# Altium footprint library THU VIEN PCB.PCBLib: 534 footprints (part 25 of 34)
Each footprint in its own frame and in the unit in brackets; x right, y up, seen from the top. Pads: shape width x height; smd on the part's side, far side on the other; paste and mask are expansions set on the pad; w line width, h text height; cw(c..) or ccw(c..) is an arc to the next point about the centre after c.
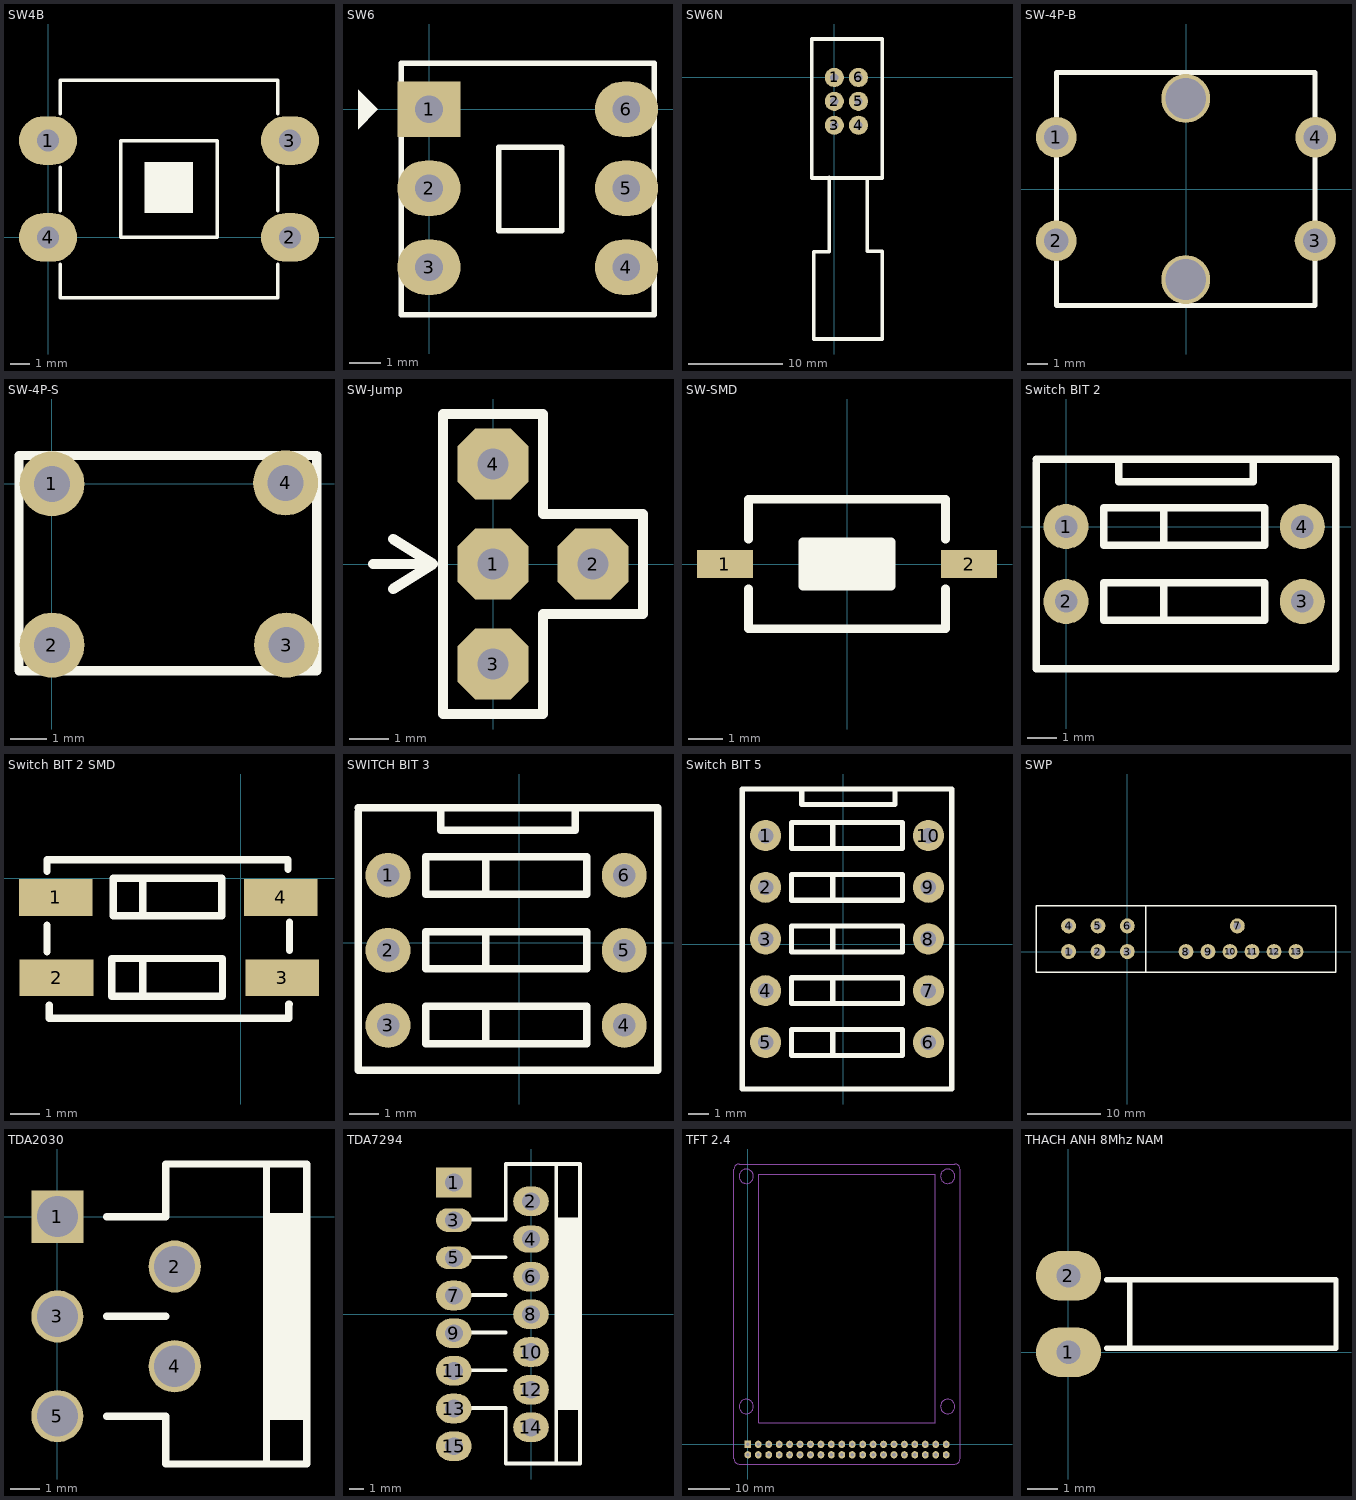
[diagram p24: the footprints below, top view; thin cyan lines are the x and y axes]

## SW4B [mil] "SW button 4pin, 450 x 450 mil"
height 100
pads (4):
  oval 120x100 hole 45: 1(0,200) 2(500,0) 3(500,200) 4(0,0)
Top Overlay:
  rectangle: 199,50 300,156
  lines w7: 25,-55 25,-125 475,-125 475,-55 ; 25,55 25,145 ; 25,255 25,325 475,325 475,255 ; 475,55 475,145 ; 150,0 350,0 350,200 150,200 150,0
3D body "SW3dPS-omron b3w-4000 switch.STEP": height 169.29, standoff -57.09, extent -3.21,-129.22 469.23,343.23

## SW6 [mil] "SW DTDP - 6Pin 260x300x300 mil"
pads (6):
  rect 80x70 hole 35: 1(0,0)
  oval 80x70 hole 35: 2(0,-100) 3(0,-200) 4(250,-200) 5(250,-100) 6(250,0)
Top Overlay:
  region: -90,25 -65,0 -90,-25
  lines w7: -35,-260 -35,58 285,58 285,-260 -35,-260 ; 88,-154 88,-48 168,-48 168,-154 88,-154
3D body "User Library-PSM1-0-0.STEP": height 532.1, standoff -137.19, extent -33.48,-259.48 281.48,55.49

## SW6N [mil]
pads (6):
  round 80 hole 35: 1(0,0) 2(0,-100) 3(0,-200) 4(101,-200) 5(101,-100) 6(101,0)
Top Overlay:
  lines w15: -21,-419 -21,-730 -87,-730 -87,-1095 201,-1095 201,-728 137,-728 137,-421 142,-421 ; -95,-421 -95,161 200,161 200,-421 -95,-421
3D body "User Library-DPDT Push Switch-1.STEP": height 394.31, standoff -156.88, extent -95,-1096.66 200.28,161.56

## SW-4P-B [mm] "Nut bam lon"
pads (6):
  round 2 hole 1.2: 1(-6.375,2.54) 2(-6.375,-2.54) 3(6.325,-2.54) 4(6.35,2.54)
  round 2.4 hole 2: ""(-0.025,-4.445) ""(-0.025,4.445)
Top Overlay:
  lines w0.254: -6.375,-5.715 6.325,-5.715 6.325,5.715 -6.375,5.715 -6.375,-5.715
3D body "User Library-Button-BIG-4.step": height 9.5, standoff -3.5, extent -6.936,-6 6.937,6

## SW-4P-S [mm]
height 5.59
pads (4):
  round 1.8 hole 1: 1(0,0) 2(0,-4.47) 3(6.502,-4.47) 4(6.477,0.025)
Top Overlay:
  lines w0.254: -0.914,-5.182 7.341,-5.182 7.341,0.787 6.934,0.787 -0.914,0.787 -0.914,-5.182
3D body "User Library-Button-small-4pin.step": height 9.52, standoff -3.48, extent -0.864,-5.235 7.348,0.765

## SW-Jump [mm]
pads (4):
  oct 1.8x1.8 hole 0.8: 1(0,0) 2(2.54,0) 3(0,-2.54) 4(0,2.54)
Top Overlay:
  lines w0.254: -3.048,0 -1.524,0 ; -2.54,-0.635 -1.524,0 ; -2.54,0.635 -1.524,0 ; -1.27,-3.81 1.27,-3.81 1.27,-1.27 3.81,-1.27 3.81,1.27 1.27,1.27 1.27,3.81 -1.27,3.81 -1.27,-1.27 -1.27,1.27 -1.27,-3.81

## SW-SMD [mm] "Switch SMD type"
pads (2):
  rect 1.6x0.8 smd: 1(-3.5,0) 2(3.5,0)
Top Overlay:
  rectangle: -1.27,-0.635 1.27,0.635
  lines w0.254: -2.819,-0.711 -2.819,-1.854 2.819,-1.854 2.819,-0.711 ; -2.819,0.711 -2.819,1.854 2.819,1.854 2.819,0.711 ; -1.27,-0.635 -1.27,0.635 1.27,0.635 1.27,-0.635 -1.27,-0.635
3D body "User Library-Button-SMD.step": height 2.5, standoff 0, extent -3.05,-1.85 3.05,1.85

## Switch BIT 2 [mil]
pads (4):
  round 60 hole 30: 1(0,0) 2(0,-100) 3(315,-100) 4(315,0)
Top Overlay:
  lines w10: -40,85 -40,-190 360,-190 360,90 -40,90 ; 70,85 70,60 250,60 250,85 ; 130,-125 130,-75 ; 130,-25 130,20 ; 50,-125 265,-125 265,-75 50,-75 50,-125 ; 50,-25 50,25 265,25 265,-25 50,-25
3D body "DIP Switch 2.step": height 272.26, standoff -125.38, extent -44,-183 356,76.84

## Switch BIT 2 SMD [mil]
pads (4):
  rect 100x50 smd: 1(-251,-26) 2(-250,-135) 3(56,-135) 4(54,-26)
Top Overlay:
  lines w10: -263,-100 -263,-64 ; -263,9 -263,25 -249,25 ; -260,-172 -260,-190 65,-190 65,-171 66,-171 ; -248,25 64,25 64,12 ; -133,-157 -133,-112 ; -133,-49 -133,0 -132,0 ; 66,-98 66,-60 ; -175,-160 -175,-109 -25,-109 -25,-160 -175,-160 ; -173,-51 -173,0 -26,0 -26,-51 -173,-51
3D body "Switch 2.step": height 165.96, standoff 0.6, extent -247,-182 53,18

## SWITCH BIT 3 [mil]
pads (6):
  round 60 hole 30: 1(-175,90) 2(-175,-10) 3(-175,-110) 4(140,-110) 5(140,-10) 6(140,90)
Top Overlay:
  lines w10: -215,175 -215,-170 185,-170 185,180 -215,180 ; -105,175 -105,150 75,150 75,175 ; -45,-135 -45,-85 ; -45,-35 -45,15 ; -45,65 -45,110 ; -125,-135 90,-135 90,-85 -125,-85 -125,-135 ; -125,-35 -125,15 90,15 90,-35 -125,-35 ; -125,65 90,65 90,115 -125,115 -125,65
3D body "User Library-DIP-Schalter SMD 3polig RM2 54.step": height 165.96, standoff 0.6, extent -170,-160 130,140

## Switch BIT 5 [mil]
pads (10):
  round 60 hole 30: 1(-150,210) 2(-150,110) 3(-150,10) 4(-150,-90) 5(-150,-190) 6(165,-190) 7(165,-90) 8(165,10) 9(165,110) 10(165,210)
Top Overlay:
  lines w10: -80,295 -80,270 100,270 100,295 ; -20,-215 -20,-165 ; -20,-115 -20,-65 ; -20,-15 -20,35 ; -20,85 -20,135 ; -20,185 -20,230 ; -195,-280 -195,300 210,300 210,-280 -195,-280 ; -100,-215 115,-215 115,-165 -100,-165 -100,-215 ; -100,-115 115,-115 115,-65 -100,-65 -100,-115 ; -100,-15 115,-15 115,35 -100,35 -100,-15 ; -100,85 -100,135 115,135 115,85 -100,85 ; -100,185 115,185 115,235 -100,235 -100,185
3D body "Switch 5.step": height 130.52, standoff -34.83, extent -140,-240 160,260

## SWP [mil] "SW Power"
height 100
pads (13):
  round 80 hole 40: 1(-314.96,0) 2(-157.48,0) 3(0,0) 4(-314.96,137.8) 5(-157.48,137.8) 6(0,137.8) 7(590.55,137.8) 8(314.96,0) 9(433.07,0) 10(551.18,0) 11(669.29,0) 12(787.4,0) 13(905.51,0)
Top Overlay:
  lines w8: 100,-109.33 100,245 ; -490,-110 1120,-110 1120,245 -490,245 -490,-110

## TDA2030 [mm]
pads (5):
  rect 1.778x1.778 hole 1.4 unplated: 1(0,0)
  round 1.778 hole 1.4 unplated: 2(4,-1.7) 3(0,-3.4) 4(4,-5.1) 5(0,-6.8)
Top Overlay:
  rectangle: 7.13,-6.807 8.5,0
  lines w0.254: 1.676,-6.8 3.7,-6.8 3.7,-8.433 8.5,-8.433 8.5,-3.404 8.5,1.796 3.7,1.796 3.7,0 1.676,0 ; 1.676,-3.4 3.7,-3.4 ; 7.13,-8.433 7.13,0 ; 7.13,-6.8 8.5,-6.8 ; 7.13,1.796 7.13,0 ; 8.5,0 7.13,0

## TDA7294 [mm]
pads (15):
  rect 2.4x2 hole 1.2: 1(-5.219,8.889)
  oval 2.4x2 hole 1.2: 2(-0.019,7.619) 6(-0.019,2.539) 7(-5.219,1.269) 8(-0.019,-0.001) 9(-5.219,-1.271) 10(-0.019,-2.541) 11(-5.219,-3.811) 12(-0.019,-5.081) 13(-5.219,-6.351) 14(-0.019,-7.621) 15(-5.219,-8.891)
  oval 2.4x1.6 hole 1.2: 3(-5.219,6.349)
  oval 2.4x1.8 hole 1.2: 4(-0.019,5.079)
  oval 2.4x1.5 hole 1.2: 5(-5.219,3.809)
Top Overlay:
  rectangle: 1.681,-6.26 3.281,6.389
  lines w0.254: -4.742,-6.311 -1.719,-6.311 ; -4.742,-3.771 -1.719,-3.771 ; -4.742,-1.231 -1.719,-1.231 ; -4.742,1.309 -1.719,1.309 ; -4.742,3.849 -1.719,3.849 ; -4.742,6.389 -1.719,6.389 -1.719,10.139 3.281,10.139 3.281,0.039 3.281,-10.061 -1.719,-10.061 -1.719,-6.311 ; -1.719,-7.682 -1.719,-6.311 ; 1.681,-10.061 1.681,8.625 1.681,10.139 ; 1.681,-6.311 3.281,-6.311 3.281,-8.241 ; 1.681,6.389 3.281,6.389

## TFT 2.4 [mil]
pads (40):
  rect 65x70 hole 35: 1(-0.86,-0.98)
  oval 65x70 hole 35: 2(99.14,-0.98) 3(199.14,-0.98) 4(299.14,-0.98) 5(399.14,-0.98) 6(499.14,-0.98) 7(599.14,-0.98) 8(699.14,-0.98) 9(799.14,-0.98) 10(899.14,-0.98) 11(999.14,-0.98) 12(1099.14,-0.98) 13(1199.14,-0.98) 14(1299.14,-0.98) 15(1399.14,-0.98) 16(1499.14,-0.98) 17(1599.14,-0.98) 18(1699.14,-0.98) 19(1799.14,-0.98) 20(1899.14,-0.98) 21(-0.86,-100.98) 22(99.14,-100.98) 23(199.14,-100.98) 24(299.14,-100.98) 25(399.14,-100.98) 26(499.14,-100.98) 27(599.14,-100.98) 28(699.14,-100.98) 29(799.14,-100.98) 30(899.14,-100.98) 31(999.14,-100.98) 32(1099.14,-100.98) 33(1199.14,-100.98) 34(1299.14,-100.98) 35(1399.14,-100.98) 36(1499.14,-100.98) 37(1599.14,-100.98) 38(1699.14,-100.98) 39(1799.14,-100.98) 40(1899.14,-100.98)
Mechanical 15:
  circle w10: c-15.75,362.2 r68.9
  circle w10: c-15.75,2566.93 r68.9
  circle w10: c1913.39,2566.93 r68.9
  circle w10: c1913.39,362.2 r68.9
  lines w10: 105.14,956.02 105.14,2586.61 ; 105.31,960.63 105.31,206.69 1794.29,206.69 1794.29,1017.72 1794.29,2586.61 1755.91,2586.61 105.31,2586.61 ; -133.86,-138.98 ccw(c-83.86,-138.98) -83.86,-188.98 1982.14,-188.98 ccw(c1982.14,-138.98) 2032.14,-138.98 2032.14,2635.02 ccw(c1982.14,2635.02) 1982.14,2685.02 -10.86,2685.02 -83.86,2685.02 ccw(c-83.86,2635.02) -133.86,2635.02 -133.86,-138.98
  text "TFT 2.4 V2.1" at 1968.5,881.89 h196.85

## THACH ANH 8Mhz NAM [mil] "Crystal for 32,768kHz, 2pin"
height 150
pads (2):
  oval 85x65 hole 31: 1(0,0) 2(0,100)
Top Overlay:
  lines w7: 50,5 80,5 ; 50,95 80,95 ; 80,5 350,5 350,95 80,95 ; 80,5 80,95
3D body "User Library-DT-26-2.STEP": height 59.37, standoff -37.91, extent -4.97,-6.99 344.97,105